# Altium footprint library Transformers.PcbLib: 81 footprints (part 5 of 6)
Each footprint in its own frame and in the unit in brackets; x right, y up, seen from the top. Pads: shape width x height; smd on the part's side, far side on the other; paste and mask are expansions set on the pad; w line width, h text height; cw(c..) or ccw(c..) is an arc to the next point about the centre after c.
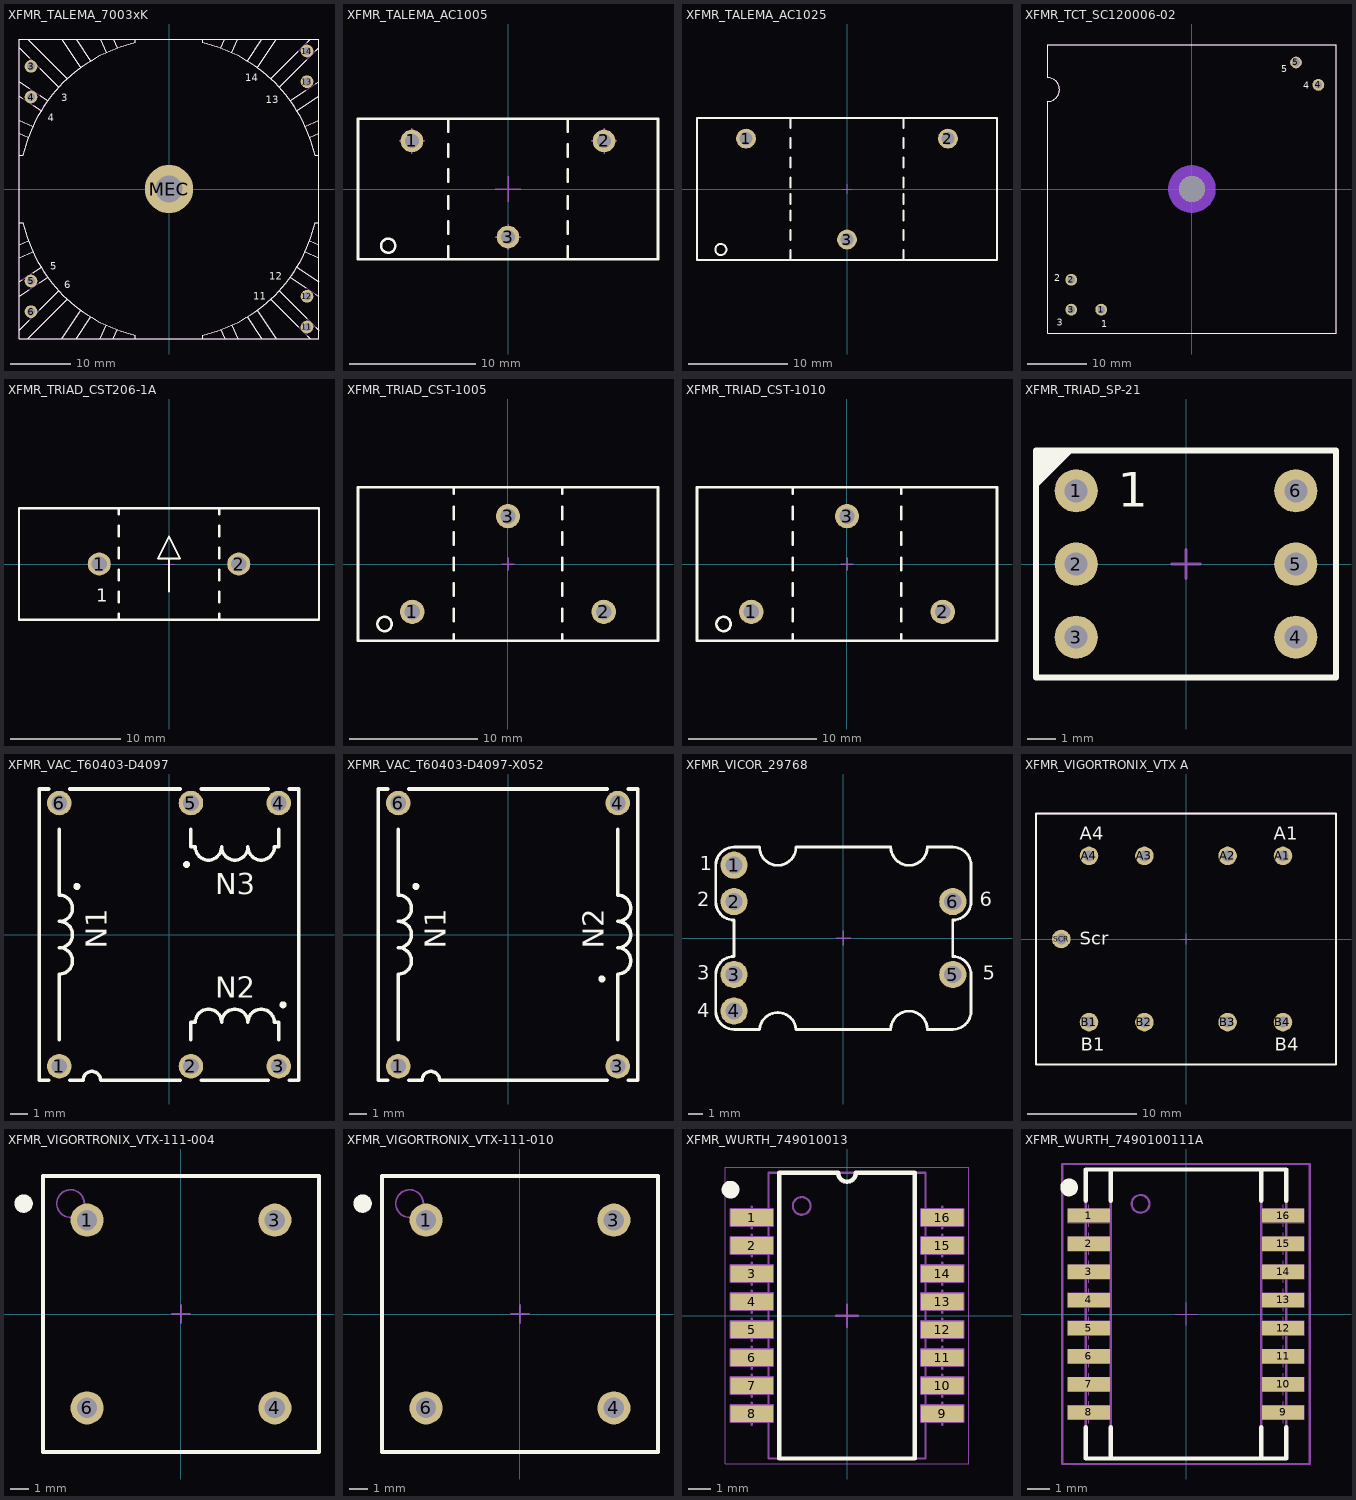
[diagram p4: the footprints below, top view; thin cyan lines are the x and y axes]

## XFMR_TALEMA_7003xK [mm] "7VA Toroidal Transformer, Body 49.7mm x 49.7mm, 70000 Serie"
height 23.1
pads (9):
  round 2.1 hole 1.4: 3(-22.86,20.32) 4(-22.86,15.24) 5(-22.86,-15.24) 6(-22.86,-20.32) 11(22.86,-22.86) 12(22.86,-17.78) 13(22.86,17.78) 14(22.86,22.86)
  round 8 hole 4.5: MEC(0,0)
Top Overlay:
  lines w0.2: -24.85,-5.6 -24.199,-5.6 ccw(c0.005,0.005) -5.6,-24.199 -5.6,-24.84 ; -24.85,5.6 -24.199,5.6 cw(c0.005,-0.005) -5.6,24.199 -5.6,24.84 ; -24.84,-23.426 -23.154,-21.74 ; -24.84,-17.8 -23.138,-16.663 ; -24.84,-15.395 -24.295,-15.031 ; -24.84,-11.371 -22.546,-10.421 ; -24.84,-9.207 -23.311,-8.573 ; -24.84,9.207 -23.311,8.573 ; -24.84,11.371 -22.546,10.421 ; -24.84,15.395 -24.295,15.031 ; -24.84,17.8 -23.138,16.663 ; -24.84,23.426 -23.154,21.74 ; -23.426,-24.84 -16.842,-18.256 ; -23.426,24.84 -16.842,18.256 ; -22.504,-13.834 -21.191,-12.957 ; -22.504,13.834 -21.191,12.957 ; -21.44,-20.026 -18.256,-16.842 ; -21.44,20.026 -18.256,16.842 ; -21.439,-15.528 -20.08,-14.619 ; -21.439,15.528 -20.08,14.619 ; -17.8,-24.84 -14.619,-20.08 ; -17.8,24.84 -14.619,20.08 ; -15.395,-24.84 -12.957,-21.191 ; -15.395,24.84 -12.957,21.191 ; -11.371,-24.84 -10.421,-22.546 ; -11.371,24.84 -10.421,22.546 ; -9.207,-24.84 -8.573,-23.311 ; -9.207,24.84 -8.573,23.311 ; 5.6,-24.84 5.6,-24.199 ccw(c-0.005,0.005) 24.199,-5.6 24.85,-5.6 ; 5.6,24.84 5.6,24.199 cw(c-0.005,-0.005) 24.199,5.6 24.85,5.6 ; 8.573,-23.311 9.207,-24.84 ; 8.573,23.311 9.207,24.84 ; 10.421,-22.546 11.371,-24.84 ; 10.421,22.546 11.371,24.84 ; 12.957,-21.191 15.395,-24.84 ; 12.957,21.191 15.395,24.84 ; 14.619,-20.08 17.8,-24.84 ; 14.619,20.08 17.8,24.84 ; 16.842,-18.256 21.41,-22.825 ; 16.842,18.256 21.41,22.825 ; 18.256,-16.842 22.825,-21.41 ; 18.256,16.842 22.825,21.41 ; 20.08,-14.619 22.66,-16.344 ; 20.08,14.619 22.66,16.344 ; 21.191,-12.957 24.84,-15.395 ; 21.191,12.957 24.84,15.395 ; 22.546,-10.421 24.84,-11.371 ; 22.546,10.421 24.84,11.371 ; 22.895,-24.31 23.426,-24.84 ; 22.895,24.31 23.426,24.84 ; 23.311,-8.573 24.84,-9.207 ; 23.311,8.573 24.84,9.207 ; 24.263,-17.415 24.84,-17.8 ; 24.263,17.415 24.84,17.8 ; 24.31,-22.895 24.84,-23.426 ; 24.31,22.895 24.84,23.426 ; -24.85,-24.85 -24.84,24.84 24.85,24.84 24.84,-24.84 -24.85,-24.85 ; -24.85,-24.85 24.85,-24.85 24.85,24.85 -24.85,24.85 -24.85,-24.85
  text "14" at 12.625,17.875 h1.2
  text "13" at 16.05,14.175 h1.2
  text "11" at 13.925,-18.325 h1.2
  text "12" at 16.6,-15 h1.2
  text "5" at -19.65,-13.375 h1.2
  text "6" at -17.35,-16.475 h1.2
  text "4" at -20.1,11.25 h1.2
  text "3" at -17.85,14.55 h1.2
Mechanical 8:
  lines w0.1: -23.36,-20.32 -22.86,-20.32 ; -23.36,-15.24 -22.86,-15.24 ; -23.36,15.24 -22.86,15.24 ; -23.36,20.32 -22.86,20.32 ; -22.86,-20.82 -22.86,-20.32 ; -22.86,-19.82 -22.86,-20.32 ; -22.86,-15.74 -22.86,-15.24 ; -22.86,-14.74 -22.86,-15.24 ; -22.86,14.74 -22.86,15.24 ; -22.86,15.74 -22.86,15.24 ; -22.86,19.82 -22.86,20.32 ; -22.86,20.82 -22.86,20.32 ; -22.36,-20.32 -22.86,-20.32 ; -22.36,-15.24 -22.86,-15.24 ; -22.36,15.24 -22.86,15.24 ; -22.36,20.32 -22.86,20.32 ; -0.5,0 0,0 ; 0,-0.5 0,0 ; 0,0.5 0,0 ; 0.5,0 0,0 ; 22.36,-22.86 22.86,-22.86 ; 22.36,-17.78 22.86,-17.78 ; 22.36,17.78 22.86,17.78 ; 22.36,22.86 22.86,22.86 ; 22.86,-23.36 22.86,-22.86 ; 22.86,-22.36 22.86,-22.86 ; 22.86,-18.28 22.86,-17.78 ; 22.86,-17.28 22.86,-17.78 ; 22.86,17.28 22.86,17.78 ; 22.86,18.28 22.86,17.78 ; 22.86,22.36 22.86,22.86 ; 22.86,23.36 22.86,22.86 ; 23.36,-22.86 22.86,-22.86 ; 23.36,-17.78 22.86,-17.78 ; 23.36,17.78 22.86,17.78 ; 23.36,22.86 22.86,22.86
Mechanical 14:
  lines w0.1: -24.85,-5.6 -24.199,-5.6 ccw(c0.005,0.005) -5.6,-24.199 -5.6,-24.84 ; -24.85,5.6 -24.199,5.6 cw(c0.005,-0.005) -5.6,24.199 -5.6,24.84 ; -24.84,-23.426 -18.256,-16.842 ; -24.84,-17.8 -20.08,-14.619 ; -24.84,-15.395 -21.191,-12.957 ; -24.84,-11.371 -22.546,-10.421 ; -24.84,-9.207 -23.311,-8.573 ; -24.84,9.207 -23.311,8.573 ; -24.84,11.371 -22.546,10.421 ; -24.84,15.395 -21.191,12.957 ; -24.84,17.8 -20.08,14.619 ; -24.84,23.426 -18.256,16.842 ; -23.426,-24.84 -16.842,-18.256 ; -23.426,24.84 -16.842,18.256 ; -17.8,-24.84 -14.619,-20.08 ; -17.8,24.84 -14.619,20.08 ; -15.395,-24.84 -12.957,-21.191 ; -15.395,24.84 -12.957,21.191 ; -11.371,-24.84 -10.421,-22.546 ; -11.371,24.84 -10.421,22.546 ; -9.207,-24.84 -8.573,-23.311 ; -9.207,24.84 -8.573,23.311 ; 5.6,-24.84 5.6,-24.199 ccw(c-0.005,0.005) 24.199,-5.6 24.85,-5.6 ; 5.6,24.84 5.6,24.199 cw(c-0.005,-0.005) 24.199,5.6 24.85,5.6 ; 8.573,-23.311 9.207,-24.84 ; 8.573,23.311 9.207,24.84 ; 10.421,-22.546 11.371,-24.84 ; 10.421,22.546 11.371,24.84 ; 12.957,-21.191 15.395,-24.84 ; 12.957,21.191 15.395,24.84 ; 14.619,-20.08 17.8,-24.84 ; 14.619,20.08 17.8,24.84 ; 16.842,-18.256 23.426,-24.84 ; 16.842,18.256 23.426,24.84 ; 18.256,-16.842 24.84,-23.426 ; 18.256,16.842 24.84,23.426 ; 20.08,-14.619 24.84,-17.8 ; 20.08,14.619 24.84,17.8 ; 21.191,-12.957 24.84,-15.395 ; 21.191,12.957 24.84,15.395 ; 22.546,-10.421 24.84,-11.371 ; 22.546,10.421 24.84,11.371 ; 23.311,-8.573 24.84,-9.207 ; 23.311,8.573 24.84,9.207 ; -24.85,-24.85 -24.84,24.84 24.85,24.84 24.84,-24.84 -24.85,-24.85 ; -24.85,-24.85 24.85,-24.85 24.85,24.85 -24.85,24.85 -24.85,-24.85
3D body "XFMR_TALEMA_7003xK.stp": height 23.1, standoff -3.8, extent -24.85,-24.85 24.85,24.85

## XFMR_TALEMA_AC1005 [mm] "Low Cost 50/60Hz 5A Current Transformer, Body 23.8mm x 11.12mm"
height 23.8
pads (3):
  round 1.8 hole 1.1: 1(-7.62,3.81) 2(7.62,3.81) 3(0,-3.81)
Top Overlay:
  circle w0.2: c-9.5,-4.5 r0.559
  lines w0.2: -4.75,-5.56 -4.75,-4.56 ; -4.75,-3.56 -4.75,-2.56 ; -4.75,-1.56 -4.75,-0.56 ; -4.75,0.56 -4.75,1.56 ; -4.75,2.56 -4.75,3.56 ; -4.75,4.56 -4.75,5.56 ; 4.75,-5.56 4.75,-4.56 ; 4.75,-3.56 4.75,-2.56 ; 4.75,-1.56 4.75,-0.56 ; 4.75,0.56 4.75,1.56 ; 4.75,2.56 4.75,3.56 ; 4.75,4.56 4.75,5.56 ; -11.9,-5.56 -11.9,5.56 11.9,5.56 11.9,-5.56 -11.9,-5.56
Mechanical 8:
  lines w0.1: -8.62,3.81 -7.62,3.81 ; -7.62,2.81 -7.62,3.81 ; -7.62,4.81 -7.62,3.81 ; -6.62,3.81 -7.62,3.81 ; -1,-3.81 0,-3.81 ; -1,0 0,0 ; 0,-4.81 0,-3.81 ; 0,-2.81 0,-3.81 ; 0,-1 0,0 ; 0,1 0,0 ; 1,-3.81 0,-3.81 ; 1,0 0,0 ; 6.62,3.81 7.62,3.81 ; 7.62,2.81 7.62,3.81 ; 7.62,4.81 7.62,3.81 ; 8.62,3.81 7.62,3.81
Mechanical 14:
  circle w0.1: c-9.5,-4.5 r0.559
  lines w0.1: -4.75,-5.56 -4.75,-4.56 ; -4.75,-3.56 -4.75,-2.56 ; -4.75,-1.56 -4.75,-0.56 ; -4.75,0.56 -4.75,1.56 ; -4.75,2.56 -4.75,3.56 ; -4.75,4.56 -4.75,5.56 ; 4.75,-5.56 4.75,-4.56 ; 4.75,-3.56 4.75,-2.56 ; 4.75,-1.56 4.75,-0.56 ; 4.75,0.56 4.75,1.56 ; 4.75,2.56 4.75,3.56 ; 4.75,4.56 4.75,5.56 ; -11.9,-5.56 -11.9,5.56 11.9,5.56 11.9,-5.56 -11.9,-5.56
3D body "XFMR_TALEMA_AC1005.stp": height 23.8, standoff -3.8, extent -11.9,-5.56 11.9,5.56

## XFMR_TALEMA_AC1025 [mm] "Low Cost 50/60Hz 25A Current Transformer, Body 30.2mm x 14.3mm"
height 30.2
pads (3):
  round 2 hole 1.3: 1(-10.16,5.07) 2(10.16,5.07) 3(0,-5.09)
Top Overlay:
  circle w0.2: c-12.7,-6.09 r0.559
  lines w0.2: -5.7,-7.15 -5.7,-6.15 ; -5.7,-5.15 -5.7,-4.15 ; -5.7,-3.15 -5.7,-2.15 ; -5.7,-1.5 -5.7,-0.5 ; -5.7,0.15 -5.7,1.15 ; -5.7,2.15 -5.7,3.15 ; -5.7,4.15 -5.7,5.15 ; -5.7,6.15 -5.7,7.15 ; 5.7,-7.15 5.7,-6.15 ; 5.7,-5.15 5.7,-4.15 ; 5.7,-3.15 5.7,-2.15 ; 5.7,-1.5 5.7,-0.5 ; 5.7,0.15 5.7,1.15 ; 5.7,2.15 5.7,3.15 ; 5.7,4.15 5.7,5.15 ; 5.7,6.15 5.7,7.15 ; -15.1,-7.15 15.1,-7.15 15.1,7.15 -15.1,7.15 -15.1,-7.15
Mechanical 8:
  lines w0.1: -10.66,5.07 -10.16,5.07 ; -10.16,4.57 -10.16,5.07 ; -10.16,5.57 -10.16,5.07 ; -9.66,5.07 -10.16,5.07 ; -0.5,-5.09 0,-5.09 ; -0.5,0 0,0 ; 0,-5.59 0,-5.09 ; 0,-4.59 0,-5.09 ; 0,-0.5 0,0 ; 0,0.5 0,0 ; 0.5,-5.09 0,-5.09 ; 0.5,0 0,0 ; 9.66,5.07 10.16,5.07 ; 10.16,4.57 10.16,5.07 ; 10.16,5.57 10.16,5.07 ; 10.66,5.07 10.16,5.07
Mechanical 14:
  circle w0.1: c-12.7,-6.09 r0.559
  lines w0.1: -5.7,-7.15 -5.7,-6.15 ; -5.7,-5.15 -5.7,-4.15 ; -5.7,-3.15 -5.7,-2.15 ; -5.7,-1.5 -5.7,-0.5 ; -5.7,0.15 -5.7,1.15 ; -5.7,2.15 -5.7,3.15 ; -5.7,4.15 -5.7,5.15 ; -5.7,6.15 -5.7,7.15 ; 5.7,-7.15 5.7,-6.15 ; 5.7,-5.15 5.7,-4.15 ; 5.7,-3.15 5.7,-2.15 ; 5.7,-1.5 5.7,-0.5 ; 5.7,0.15 5.7,1.15 ; 5.7,2.15 5.7,3.15 ; 5.7,4.15 5.7,5.15 ; 5.7,6.15 5.7,7.15 ; -15.1,-7.15 -15.1,7.15 15.1,7.15 15.1,-7.15 -15.1,-7.15
3D body "XFMR_TALEMA_AC1025.stp": height 30.19, standoff -3.8, extent -15.1,-7.15 15.1,7.15

## XFMR_TCT_SC120006-02 [mm] "Pulse Transformer"
height 40
pads (6):
  round 2 hole 1.3: 1(-15.42,-20.5) 2(-20.5,-15.42) 3(-20.5,-20.5) 4(21.51,17.7) 5(17.7,21.51)
  round 0.5 hole 4.4 unplated mask+1.95: 6(0,0)
Bottom Layer keep-out:
  region: 0,-4 -0.262,-4 -0.782,-3.932 -1.289,-3.796 -1.773,-3.595 -2.227,-3.333 -2.643,-3.014 -3.014,-2.643 -3.333,-2.227 -3.595,-1.773 -3.796,-1.289 -3.932,-0.782 -4,-0.262 -4,0 -4,0.262 -3.932,0.782 -3.796,1.289 -3.595,1.773 -3.333,2.227 -3.014,2.643 -2.643,3.014 -2.227,3.333 -1.773,3.595 -1.289,3.796 -0.782,3.932 -0.262,4 0,4 0.262,4 0.782,3.932 1.289,3.796 1.773,3.595 2.227,3.333 2.643,3.014 3.014,2.643 3.333,2.227 3.595,1.773 3.796,1.289 3.932,0.782 4,0.262 4,0 4,-0.262 3.932,-0.782 3.796,-1.289 3.595,-1.773 3.333,-2.227 3.014,-2.643 2.643,-3.014 2.227,-3.333 1.773,-3.595 1.289,-3.796 0.782,-3.932 0.262,-4
Top Overlay:
  lines w0.2: -24.5,-24.5 24.5,-24.5 24.5,24.5 -24.5,24.5 -24.5,18.9 cw(c-24.5,16.9) -24.5,14.9 -24.5,-24.5
  text "1" at -15.434,-23.475 h1.2
  text "2" at -23.368,-15.725 h1.2
  text "3" at -23.013,-23.225 h1.2
  text "4" at 18.943,17.025 h1.2
  text "5" at 15.172,19.825 h1.2
Mechanical 8:
  lines w0.1: -21,-20.5 -20.5,-20.5 ; -21,-15.42 -20.5,-15.42 ; -20.5,-21 -20.5,-20.5 ; -20.5,-20 -20.5,-20.5 ; -20.5,-15.92 -20.5,-15.42 ; -20.5,-14.92 -20.5,-15.42 ; -20,-20.5 -20.5,-20.5 ; -20,-15.42 -20.5,-15.42 ; -15.92,-20.5 -15.42,-20.5 ; -15.42,-21 -15.42,-20.5 ; -15.42,-20 -15.42,-20.5 ; -14.92,-20.5 -15.42,-20.5 ; -0.5,0 0,0 ; 0,-0.5 0,0 ; 0,0.5 0,0 ; 0.5,0 0,0 ; 17.2,21.51 17.7,21.51 ; 17.7,21.01 17.7,21.51 ; 17.7,22.01 17.7,21.51 ; 18.2,21.51 17.7,21.51 ; 21.01,17.7 21.51,17.7 ; 21.51,17.2 21.51,17.7 ; 21.51,18.2 21.51,17.7 ; 22.01,17.7 21.51,17.7
Mechanical 14:
  circle w0.1: c0,0 r2.2
  lines w0.1: -24.5,-24.5 24.5,-24.5 24.5,24.5 -24.5,24.5 -24.5,18.9 cw(c-24.5,16.9) -24.5,14.9 -24.5,-24.5
  text "1" at -15.434,-23.475 h1.2
  text "2" at -23.368,-15.725 h1.2
  text "3" at -23.013,-23.225 h1.2
  text "4" at 18.943,17.025 h1.2
  text "5" at 15.172,19.825 h1.2
3D body "XFMR_TCT_SC120006-02.stp": height 40, standoff -3.6, extent -24.5,-24.5 24.5,24.5

## XFMR_TRIAD_CST206-1A [mm] "Current Sensing Transformer - Body 27.305 x 10.16mm x 31.115 H"
height 31.115
pads (2):
  round 2.1 hole 1.4: 1(-6.35,0) 2(6.35,0)
Top Overlay:
  lines w0.2: -4.572,-5.08 -4.572,-4.5 ; -4.572,-3.5 -4.572,-2.5 ; -4.572,-1.5 -4.572,-0.5 ; -4.572,0.5 -4.572,1.5 ; -4.572,2.5 -4.572,3.5 ; -4.572,4.5 -4.572,5.08 ; 0,-2.5 0,0.5 ; 4.572,-5.08 4.572,-4.5 ; 4.572,-3.5 4.572,-2.5 ; 4.572,-1.5 4.572,-0.5 ; 4.572,0.5 4.572,1.5 ; 4.572,2.5 4.572,3.5 ; 4.572,4.5 4.572,5.08 ; 0,0.5 1,0.5 0,2.5 -1,0.5 0,0.5 ; -13.653,-5.08 0,-5.08 13.653,-5.08 13.653,5.08 0,5.08 -13.653,5.08 -13.653,-5.08
  text "1" at -6.636,-3.417 h1.2
Mechanical 8:
  lines w0.1: -6.85,0 -6.35,0 ; -6.35,-0.5 -6.35,0 ; -6.35,0.5 -6.35,0 ; -5.85,0 -6.35,0 ; -0.5,0 0,0 ; 0,-0.5 0,0 ; 0,0.5 0,0 ; 0.5,0 0,0 ; 5.85,0 6.35,0 ; 6.35,-0.5 6.35,0 ; 6.35,0.5 6.35,0 ; 6.85,0 6.35,0
Mechanical 14:
  lines w0.1: -4.572,-5.08 -4.572,-4.5 ; -4.572,-3.5 -4.572,-2.5 ; -4.572,-1.5 -4.572,-0.5 ; -4.572,0.5 -4.572,1.5 ; -4.572,2.5 -4.572,3.5 ; -4.572,4.5 -4.572,5.08 ; 0,-2.5 0,0.5 ; 4.572,-5.08 4.572,-4.5 ; 4.572,-3.5 4.572,-2.5 ; 4.572,-1.5 4.572,-0.5 ; 4.572,0.5 4.572,1.5 ; 4.572,2.5 4.572,3.5 ; 4.572,4.5 4.572,5.08 ; 0,0.5 1,0.5 0,2.5 -1,0.5 0,0.5 ; -13.653,-5.08 0,-5.08 13.653,-5.08 13.653,5.08 0,5.08 -13.653,5.08 -13.653,-5.08
  text "1" at -6.636,-3.417 h1.2
3D body "XFMR_TRIAD_CST206-1A.stp": height 31.11, standoff -3.6, extent -13.652,-5.08 13.653,5.08

## XFMR_TRIAD_CST-1005 [mm] "Current Sensing Transformer - Body 23.5 L x 12mm W x 24.8 H"
height 24.8
pads (3):
  round 1.9 hole 1.2: 1(-7.5,-3.75) 2(7.5,-3.75) 3(0,3.75)
Top Overlay:
  circle w0.2: c-9.675,-4.7 r0.559
  lines w0.2: -4.25,-6 -4.25,-5.5 ; -4.25,-4.5 -4.25,-3.5 ; -4.25,-2.5 -4.25,-1.5 ; -4.25,-0.5 -4.25,0.5 ; -4.25,1.5 -4.25,2.5 ; -4.25,3.5 -4.25,4.5 ; -4.25,5.5 -4.25,6 ; 4.25,-6 4.25,-5.5 ; 4.25,-4.5 4.25,-3.5 ; 4.25,-2.5 4.25,-1.5 ; 4.25,-0.5 4.25,0.5 ; 4.25,1.5 4.25,2.5 ; 4.25,3.5 4.25,4.5 ; 4.25,5.5 4.25,6 ; -11.75,-6 -11.75,6 11.75,6 11.75,-6 -11.75,-6
Mechanical 8:
  lines w0.1: -8,-3.75 -7.5,-3.75 ; -7.5,-4.25 -7.5,-3.75 ; -7.5,-3.25 -7.5,-3.75 ; -7,-3.75 -7.5,-3.75 ; -0.5,0 0,0 ; -0.5,3.75 0,3.75 ; 0,-0.5 0,0 ; 0,0.5 0,0 ; 0,3.25 0,3.75 ; 0,4.25 0,3.75 ; 0.5,0 0,0 ; 0.5,3.75 0,3.75 ; 7,-3.75 7.5,-3.75 ; 7.5,-4.25 7.5,-3.75 ; 7.5,-3.25 7.5,-3.75 ; 8,-3.75 7.5,-3.75
Mechanical 14:
  circle w0.1: c-9.675,-4.7 r0.559
  lines w0.1: -4.25,-6 -4.25,-5.5 ; -4.25,-4.5 -4.25,-3.5 ; -4.25,-2.5 -4.25,-1.5 ; -4.25,-0.5 -4.25,0.5 ; -4.25,1.5 -4.25,2.5 ; -4.25,3.5 -4.25,4.5 ; -4.25,5.5 -4.25,6 ; 4.25,-6 4.25,-5.5 ; 4.25,-4.5 4.25,-3.5 ; 4.25,-2.5 4.25,-1.5 ; 4.25,-0.5 4.25,0.5 ; 4.25,1.5 4.25,2.5 ; 4.25,3.5 4.25,4.5 ; 4.25,5.5 4.25,6 ; -11.75,-6 -11.75,6 11.75,6 11.75,-6 -11.75,-6
3D body "XFMR_TRIAD_CST-1005.stp": height 24.78, standoff -3.8, extent -11.75,-6 11.75,6

## XFMR_TRIAD_CST-1010 [mm] "Current Sensing Transformer - Body 23.5 L x 12mm W x 24.8 H"
height 24.8
pads (3):
  round 1.9 hole 1.2: 1(-7.5,-3.75) 2(7.5,-3.75) 3(0,3.75)
Top Overlay:
  circle w0.2: c-9.675,-4.7 r0.559
  lines w0.2: -4.25,-6 -4.25,-5.5 ; -4.25,-4.5 -4.25,-3.5 ; -4.25,-2.5 -4.25,-1.5 ; -4.25,-0.5 -4.25,0.5 ; -4.25,1.5 -4.25,2.5 ; -4.25,3.5 -4.25,4.5 ; -4.25,5.5 -4.25,6 ; 4.25,-6 4.25,-5.5 ; 4.25,-4.5 4.25,-3.5 ; 4.25,-2.5 4.25,-1.5 ; 4.25,-0.5 4.25,0.5 ; 4.25,1.5 4.25,2.5 ; 4.25,3.5 4.25,4.5 ; 4.25,5.5 4.25,6 ; -11.75,-6 11.75,-6 11.75,6 -11.75,6 -11.75,-6
Mechanical 8:
  lines w0.1: -8,-3.75 -7.5,-3.75 ; -7.5,-4.25 -7.5,-3.75 ; -7.5,-3.25 -7.5,-3.75 ; -7,-3.75 -7.5,-3.75 ; -0.5,0 0,0 ; -0.5,3.75 0,3.75 ; 0,-0.5 0,0 ; 0,0.5 0,0 ; 0,3.25 0,3.75 ; 0,4.25 0,3.75 ; 0.5,0 0,0 ; 0.5,3.75 0,3.75 ; 7,-3.75 7.5,-3.75 ; 7.5,-4.25 7.5,-3.75 ; 7.5,-3.25 7.5,-3.75 ; 8,-3.75 7.5,-3.75
Mechanical 14:
  circle w0.1: c-9.675,-4.7 r0.559
  lines w0.1: -4.25,-6 -4.25,-5.5 ; -4.25,-4.5 -4.25,-3.5 ; -4.25,-2.5 -4.25,-1.5 ; -4.25,-0.5 -4.25,0.5 ; -4.25,1.5 -4.25,2.5 ; -4.25,3.5 -4.25,4.5 ; -4.25,5.5 -4.25,6 ; 4.25,-6 4.25,-5.5 ; 4.25,-4.5 4.25,-3.5 ; 4.25,-2.5 4.25,-1.5 ; 4.25,-0.5 4.25,0.5 ; 4.25,1.5 4.25,2.5 ; 4.25,3.5 4.25,4.5 ; 4.25,5.5 4.25,6 ; -11.75,-6 11.75,-6 11.75,6 -11.75,6 -11.75,-6
3D body "XFMR_TRIAD_CST-1005.stp": height 24.78, standoff -3.8, extent -11.75,-6 11.75,6

## XFMR_TRIAD_SP-21 [mm] "Audio Transformer- Body 10.41X7.87mm"
height 11.8
pads (6):
  round 1.5 hole 0.8: 1(-3.81,2.54) 2(-3.81,0) 3(-3.81,-2.54) 4(3.81,-2.54) 5(3.81,0) 6(3.81,2.54)
Top Overlay:
  lines w0.2: -5.205,2.75 -4.023,3.933 ; -5.205,3 -4.25,3.935 ; -5.205,3.25 -4.5,3.935 ; -5.205,3.5 -4.75,3.935 ; -5.2,3.75 -5.015,3.935 ; -5.205,-3.935 -5.205,3.935 5.205,3.935 5.205,-3.935 -5.205,-3.935
  text "1" at -2.361,1.983 h1.2
Mechanical 8:
  lines w0.1: -4.31,-2.54 -3.81,-2.54 ; -4.31,0 -3.81,0 ; -4.31,2.54 -3.81,2.54 ; -3.81,-3.04 -3.81,-2.54 ; -3.81,-2.04 -3.81,-2.54 ; -3.81,-0.5 -3.81,0 ; -3.81,0.5 -3.81,0 ; -3.81,2.04 -3.81,2.54 ; -3.81,3.04 -3.81,2.54 ; -3.31,-2.54 -3.81,-2.54 ; -3.31,0 -3.81,0 ; -3.31,2.54 -3.81,2.54 ; -0.5,0 0,0 ; 0,-0.5 0,0 ; 0,0.5 0,0 ; 0.5,0 0,0 ; 3.31,-2.54 3.81,-2.54 ; 3.31,0 3.81,0 ; 3.31,2.54 3.81,2.54 ; 3.81,-3.04 3.81,-2.54 ; 3.81,-2.04 3.81,-2.54 ; 3.81,-0.5 3.81,0 ; 3.81,0.5 3.81,0 ; 3.81,2.04 3.81,2.54 ; 3.81,3.04 3.81,2.54 ; 4.31,-2.54 3.81,-2.54 ; 4.31,0 3.81,0 ; 4.31,2.54 3.81,2.54
Mechanical 14:
  lines w0.1: -5.205,-3.935 5.205,-3.935 5.205,3.935 -5.205,3.935 -5.205,-3.935
  text "1" at -2.361,1.983 h1.2
3D body "XFMR_TRIAD_SP-21.stp": height 11.8, standoff -3.49, extent -5.205,-3.935 5.205,3.935

## XFMR_VAC_T60403-D4097 [mm] "VACUUMSCHMELZE Drive Transformer - Body 14.8X16.6mm"
height 13.5
pads (6):
  round 1.4 hole 0.9: 1(-6.25,-7.5) 2(1.25,-7.5) 3(6.25,-7.5) 4(6.25,7.5) 5(1.25,7.5) 6(-6.25,7.5)
Top Overlay:
  circle w0.2: c6.5,-4 r0.1
  circle w0.2: c1,4 r0.1
  circle w0.2: c-5.25,2.75 r0.1
  lines w0.2: -6.85,-8.3 -7.4,-8.3 -7.4,8.3 -6.85,8.3 ; -6.25,-6 -6.25,-2.25 ccw(c-6.25,-1.5) -6.25,-0.75 ccw(c-6.25,0) -6.25,0.75 ccw(c-6.25,1.5) -6.25,2.25 -6.25,6 ; -5.65,-8.3 -4.9,-8.3 cw(c-4.4,-8.3) -3.9,-8.3 0.65,-8.3 ; -5.65,8.3 0.65,8.3 ; 1.25,-6 1.25,-5 1.5,-5 cw(c2.25,-5) 3,-5 cw(c3.75,-5) 4.5,-5 cw(c5.25,-5) 6,-5 6.25,-5 6.25,-6 ; 1.25,6 1.25,5 1.5,5 ccw(c2.25,5) 3,5 ccw(c3.75,5) 4.5,5 ccw(c5.25,5) 6,5 6.25,5 6.25,6 ; 1.85,-8.3 5.65,-8.3 ; 1.85,8.3 5.65,8.3 ; 6.85,-8.3 7.4,-8.3 7.4,8.3 6.85,8.3
  text "N2" at 2.643,-3.6 h1.2
  text "N3" at 2.643,2.3 h1.2
  text "N1" at -3.55,-0.807 h1.2
Mechanical 14:
  circle w0.1: c6.5,-4 r0.1
  circle w0.1: c1,4 r0.1
  circle w0.1: c-5.25,2.75 r0.1
  lines w0.1: -6.85,-8.3 -7.4,-8.3 -7.4,8.3 -6.85,8.3 ; -6.25,-6 -6.25,-2.25 ccw(c-6.25,-1.5) -6.25,-0.75 ccw(c-6.25,0) -6.25,0.75 ccw(c-6.25,1.5) -6.25,2.25 -6.25,6 ; -5.65,-8.3 -4.9,-8.3 cw(c-4.4,-8.3) -3.9,-8.3 0.65,-8.3 ; -5.65,8.3 0.65,8.3 ; 1.25,-6 1.25,-5 1.5,-5 cw(c2.25,-5) 3,-5 cw(c3.75,-5) 4.5,-5 cw(c5.25,-5) 6,-5 6.25,-5 6.25,-6 ; 1.25,6 1.25,5 1.5,5 ccw(c2.25,5) 3,5 ccw(c3.75,5) 4.5,5 ccw(c5.25,5) 6,5 6.25,5 6.25,6 ; 1.85,-8.3 5.65,-8.3 ; 1.85,8.3 5.65,8.3 ; 6.85,-8.3 7.4,-8.3 7.4,8.3 6.85,8.3
  text "N2" at 2.643,-3.6 h1.2
  text "N3" at 2.643,2.3 h1.2
  text "N1" at -3.55,-0.807 h1.2
3D body "XFMR_VAC_T60403-D4097.stp": height 13.5, standoff -3.6, extent -7.4,-8.3 7.4,8.3

## XFMR_VAC_T60403-D4097-X052 [mm] "VACUUMSCHMELZE Drive Transformer - Body 14.8X16.6mm"
height 13.5
pads (4):
  round 1.4 hole 0.9: 1(-6.25,-7.5) 3(6.25,-7.5) 4(6.25,7.5) 6(-6.25,7.5)
Top Overlay:
  circle w0.2: c5.35,-2.525 r0.1
  circle w0.2: c-5.25,2.75 r0.1
  lines w0.2: -6.85,-8.3 -7.4,-8.3 -7.4,8.3 -6.85,8.3 ; -6.25,-6 -6.25,-2.25 ccw(c-6.25,-1.5) -6.25,-0.75 ccw(c-6.25,0) -6.25,0.75 ccw(c-6.25,1.5) -6.25,2.25 -6.25,6 ; -5.65,-8.3 -4.9,-8.3 cw(c-4.4,-8.3) -3.9,-8.3 5.65,-8.3 ; -5.65,8.3 5.65,8.3 ; 6.25,-6 6.25,-2.25 ccw(c6.25,-1.5) 6.25,-0.75 ccw(c6.25,0) 6.25,0.75 ccw(c6.25,1.5) 6.25,2.25 6.25,6 ; 6.85,-8.3 7.4,-8.3 7.4,8.3 6.85,8.3
  text "N2" at 5.45,-0.807 h1.2
  text "N1" at -3.55,-0.807 h1.2
Mechanical 14:
  circle w0.1: c5.35,-2.525 r0.1
  circle w0.1: c-5.25,2.75 r0.1
  lines w0.1: -6.85,-8.3 -7.4,-8.3 -7.4,8.3 -6.85,8.3 ; -6.25,-6 -6.25,-2.25 ccw(c-6.25,-1.5) -6.25,-0.75 ccw(c-6.25,0) -6.25,0.75 ccw(c-6.25,1.5) -6.25,2.25 -6.25,6 ; -5.65,-8.3 -4.9,-8.3 cw(c-4.4,-8.3) -3.9,-8.3 5.65,-8.3 ; -5.65,8.3 5.65,8.3 ; 6.25,-6 6.25,-2.25 ccw(c6.25,-1.5) 6.25,-0.75 ccw(c6.25,0) 6.25,0.75 ccw(c6.25,1.5) 6.25,2.25 6.25,6 ; 6.85,-8.3 7.4,-8.3 7.4,8.3 6.85,8.3
  text "N2" at 5.45,-0.807 h1.2
  text "N1" at -3.55,-0.807 h1.2
3D body "XFMR_VAC_T60403-D4097-X052.stp": height 13.5, standoff -3.6, extent -7.4,-8.3 7.4,8.3

## XFMR_VICOR_29768 [mm] "PR Bus Isolation Transformer - Body 17.78mm x 12.7"
height 9.14
pads (6):
  round 1.9 hole 1.2: 1(-7.62,5.08) 2(-7.62,2.54) 3(-7.62,-2.54) 4(-7.62,-5.08) 5(7.62,-2.54) 6(7.62,2.54)
Top Overlay:
  lines w0.2: -8.89,-5.094 ccw(c-7.62,-5.094) -7.62,-6.364 -5.842,-6.364 cw(c-4.572,-6.464) -3.302,-6.364 3.302,-6.364 cw(c4.572,-6.364) 5.842,-6.364 7.62,-6.364 ccw(c7.62,-5.094) 8.89,-5.094 8.89,-2.554 ccw(c7.62,-2.554) 7.62,-1.284 7.62,1.256 ccw(c7.62,2.526) 8.89,2.526 8.89,5.066 ccw(c7.62,5.066) 7.62,6.336 5.842,6.336 cw(c4.572,6.336) 3.302,6.336 -3.302,6.336 cw(c-4.572,6.336) -5.842,6.336 -7.62,6.336 ccw(c-7.62,5.066) -8.89,5.066 -8.89,2.526 ccw(c-7.62,2.526) -7.62,1.256 -7.62,-1.284 ccw(c-7.62,-2.554) -8.89,-2.554 -8.89,-5.094
  text "1" at -10,4.74 h1
  text "4" at -10.2,-5.5 h1
  text "2" at -10.2,2.2 h1
  text "3" at -10.2,-2.9 h1
  text "6" at 9.5,2.2 h1
  text "5" at 9.7,-2.9 h1
Mechanical 8:
  lines w0.1: -8.12,-5.08 -7.62,-5.08 ; -8.12,-2.54 -7.62,-2.54 ; -8.12,2.54 -7.62,2.54 ; -8.12,5.08 -7.62,5.08 ; -7.62,-5.58 -7.62,-5.08 ; -7.62,-4.58 -7.62,-5.08 ; -7.62,-3.04 -7.62,-2.54 ; -7.62,-2.04 -7.62,-2.54 ; -7.62,2.04 -7.62,2.54 ; -7.62,3.04 -7.62,2.54 ; -7.62,4.58 -7.62,5.08 ; -7.62,5.58 -7.62,5.08 ; -7.12,-5.08 -7.62,-5.08 ; -7.12,-2.54 -7.62,-2.54 ; -7.12,2.54 -7.62,2.54 ; -7.12,5.08 -7.62,5.08 ; -0.5,0 0,0 ; 0,-0.5 0,0 ; 0,0.5 0,0 ; 0.5,0 0,0 ; 7.12,-2.54 7.62,-2.54 ; 7.12,2.54 7.62,2.54 ; 7.62,-3.04 7.62,-2.54 ; 7.62,-2.04 7.62,-2.54 ; 7.62,2.04 7.62,2.54 ; 7.62,3.04 7.62,2.54 ; 8.12,-2.54 7.62,-2.54 ; 8.12,2.54 7.62,2.54
Mechanical 14:
  lines w0.1: -8.89,-5.094 ccw(c-7.62,-5.094) -7.62,-6.364 -5.842,-6.364 cw(c-4.572,-6.464) -3.302,-6.364 3.302,-6.364 cw(c4.572,-6.364) 5.842,-6.364 7.62,-6.364 ccw(c7.62,-5.094) 8.89,-5.094 8.89,-2.554 ccw(c7.62,-2.554) 7.62,-1.284 7.62,1.256 ccw(c7.62,2.526) 8.89,2.526 8.89,5.066 ccw(c7.62,5.066) 7.62,6.336 5.842,6.336 cw(c4.572,6.336) 3.302,6.336 -3.302,6.336 cw(c-4.572,6.336) -5.842,6.336 -7.62,6.336 ccw(c-7.62,5.066) -8.89,5.066 -8.89,2.526 ccw(c-7.62,2.526) -7.62,1.256 -7.62,-1.284 ccw(c-7.62,-2.554) -8.89,-2.554 -8.89,-5.094 ; -7.935,-5.395 -7.935,-4.765 -7.305,-4.765 -7.305,-5.395 -7.935,-5.395 ; -7.935,-2.855 -7.935,-2.225 -7.305,-2.225 -7.305,-2.855 -7.935,-2.855 ; -7.935,2.225 -7.935,2.855 -7.305,2.855 -7.305,2.225 -7.935,2.225 ; -7.935,4.765 -7.935,5.395 -7.305,5.395 -7.305,4.765 -7.935,4.765 ; 7.305,-2.855 7.305,-2.225 7.935,-2.225 7.935,-2.855 7.305,-2.855 ; 7.305,2.225 7.305,2.855 7.935,2.855 7.935,2.225 7.305,2.225
  text "5" at 9.7,-2.9 h1
  text "6" at 9.5,2.2 h1
  text "3" at -10.2,-2.9 h1
  text "2" at -10.2,2.2 h1
  text "4" at -10.2,-5.5 h1
  text "1" at -10,4.74 h1
3D body "XFMR_VICOR_29768.stp": height 9.62, standoff -3.31, extent -8.89,-6.364 8.89,6.336

## XFMR_VIGORTRONIX_VTX A [mm] "VIGORTRONIX VTX A-Serie Audio Range Transformer - Body 27.5 x 23mm"
height 22.5
pads (9):
  round 1.7 hole 1: A1(8.89,7.62) A2(3.81,7.62) A3(-3.81,7.62) A4(-8.89,7.62) B1(-8.89,-7.62) B2(-3.81,-7.62) B3(3.81,-7.62) B4(8.89,-7.62) SCR(-11.43,0)
Top Overlay:
  lines w0.2: -13.75,-11.5 -13.75,11.5 13.75,11.5 13.75,-11.5 -13.75,-11.5
  text "Scr" at -9.717,-0.52 h1.2
  text "B4" at 8.148,-10.265 h1.2
  text "B1" at -9.632,-10.265 h1.2
  text "A1" at 8.023,9.1 h1.2
  text "A4" at -9.757,9.1 h1.2
Mechanical 8:
  lines w0.1: -11.93,0 -11.43,0 ; -11.43,-0.5 -11.43,0 ; -11.43,0.5 -11.43,0 ; -10.93,0 -11.43,0 ; -9.39,-7.62 -8.89,-7.62 ; -9.39,7.62 -8.89,7.62 ; -8.89,-8.12 -8.89,-7.62 ; -8.89,-7.12 -8.89,-7.62 ; -8.89,7.12 -8.89,7.62 ; -8.89,8.12 -8.89,7.62 ; -8.39,-7.62 -8.89,-7.62 ; -8.39,7.62 -8.89,7.62 ; -4.31,-7.62 -3.81,-7.62 ; -4.31,7.62 -3.81,7.62 ; -3.81,-8.12 -3.81,-7.62 ; -3.81,-7.12 -3.81,-7.62 ; -3.81,7.12 -3.81,7.62 ; -3.81,8.12 -3.81,7.62 ; -3.31,-7.62 -3.81,-7.62 ; -3.31,7.62 -3.81,7.62 ; -0.5,0 0,0 ; 0,-0.5 0,0 ; 0,0.5 0,0 ; 0.5,0 0,0 ; 3.31,-7.62 3.81,-7.62 ; 3.31,7.62 3.81,7.62 ; 3.81,-8.12 3.81,-7.62 ; 3.81,-7.12 3.81,-7.62 ; 3.81,7.12 3.81,7.62 ; 3.81,8.12 3.81,7.62 ; 4.31,-7.62 3.81,-7.62 ; 4.31,7.62 3.81,7.62 ; 8.39,-7.62 8.89,-7.62 ; 8.39,7.62 8.89,7.62 ; 8.89,-8.12 8.89,-7.62 ; 8.89,-7.12 8.89,-7.62 ; 8.89,7.12 8.89,7.62 ; 8.89,8.12 8.89,7.62 ; 9.39,-7.62 8.89,-7.62 ; 9.39,7.62 8.89,7.62
Mechanical 14:
  lines w0.1: -13.75,-11.5 -13.75,11.5 13.75,11.5 13.75,-11.5 -13.75,-11.5
  text "Scr" at -9.717,-0.52 h1.2
  text "B4" at 8.148,-10.265 h1.2
  text "B1" at -9.632,-10.265 h1.2
  text "A1" at 8.023,9.1 h1.2
  text "A4" at -9.757,9.1 h1.2
3D body "XFMR_VIGORTRONIX_VTX A.stp": height 22.5, standoff -3.6, extent -13.75,-11.5 13.75,11.5

## XFMR_VIGORTRONIX_VTX-111-004 [mm] "VIGORTRONIX VTX Encapsulated Pulse Transformer - Body 15 x 15mm"
height 15.5
pads (4):
  round 1.8 hole 1.1: 1(-5.1,5.1) 3(5.1,5.1) 4(5.1,-5.1) 6(-5.1,-5.1)
Top Overlay:
  circle w0.5: c-8.55,6 r0.25
  lines w0.2: -7.5,-7.5 -7.5,7.5 7.5,7.5 7.5,-7.5 -7.5,-7.5
Mechanical 8:
  lines w0.1: -5.6,-5.1 -5.1,-5.1 ; -5.6,5.1 -5.1,5.1 ; -5.1,-5.6 -5.1,-5.1 ; -5.1,-4.6 -5.1,-5.1 ; -5.1,4.6 -5.1,5.1 ; -5.1,5.6 -5.1,5.1 ; -4.6,-5.1 -5.1,-5.1 ; -4.6,5.1 -5.1,5.1 ; -0.5,0 0,0 ; 0,-0.5 0,0 ; 0,0.5 0,0 ; 0.5,0 0,0 ; 4.6,-5.1 5.1,-5.1 ; 4.6,5.1 5.1,5.1 ; 5.1,-5.6 5.1,-5.1 ; 5.1,-4.6 5.1,-5.1 ; 5.1,4.6 5.1,5.1 ; 5.1,5.6 5.1,5.1 ; 5.6,-5.1 5.1,-5.1 ; 5.6,5.1 5.1,5.1
Mechanical 14:
  circle w0.1: c-6,6 r0.75
  lines w0.1: -7.5,-7.5 -7.5,7.5 7.5,7.5 7.5,-7.5 -7.5,-7.5
3D body "XFMR_VIGORTRONIX_VTX-111-004.stp": height 15.5, standoff -3.6, extent -7.5,-7.5 7.5,7.5

## XFMR_VIGORTRONIX_VTX-111-010 [mm] "VIGORTRONIX VTX Encapsulated Pulse Transformer - Body 15 x 15mm"
height 15.5
pads (4):
  round 1.8 hole 1.1: 1(-5.1,5.1) 3(5.1,5.1) 4(5.1,-5.1) 6(-5.1,-5.1)
Top Overlay:
  circle w0.5: c-8.55,6 r0.25
  lines w0.2: -7.5,-7.5 7.5,-7.5 7.5,7.5 -7.5,7.5 -7.5,-7.5
Mechanical 8:
  lines w0.1: -5.6,-5.1 -5.1,-5.1 ; -5.6,5.1 -5.1,5.1 ; -5.1,-5.6 -5.1,-5.1 ; -5.1,-4.6 -5.1,-5.1 ; -5.1,4.6 -5.1,5.1 ; -5.1,5.6 -5.1,5.1 ; -4.6,-5.1 -5.1,-5.1 ; -4.6,5.1 -5.1,5.1 ; -0.5,0 0,0 ; 0,-0.5 0,0 ; 0,0.5 0,0 ; 0.5,0 0,0 ; 4.6,-5.1 5.1,-5.1 ; 4.6,5.1 5.1,5.1 ; 5.1,-5.6 5.1,-5.1 ; 5.1,-4.6 5.1,-5.1 ; 5.1,4.6 5.1,5.1 ; 5.1,5.6 5.1,5.1 ; 5.6,-5.1 5.1,-5.1 ; 5.6,5.1 5.1,5.1
Mechanical 14:
  circle w0.1: c-6,6 r0.75
  lines w0.1: -7.5,-7.5 7.5,-7.5 7.5,7.5 -7.5,7.5 -7.5,-7.5
3D body "XFMR_VIGORTRONIX_VTX-111-010.stp": height 15.5, standoff -3.6, extent -7.5,-7.5 7.5,7.5

## XFMR_WURTH_749010013 [mm] "10/100/1000 Base-Tx  LAN Transformer, Body 7.11 x 12.95mm"
height 5.33
pads (16):
  rect 1.91x0.76 smd: 1(-4.318,4.445) 2(-4.318,3.175) 3(-4.318,1.905) 4(-4.318,0.635) 5(-4.318,-0.635) 6(-4.318,-1.905) 7(-4.318,-3.175) 8(-4.318,-4.445) 9(4.318,-4.445) 10(4.318,-3.175) 11(4.318,-1.905) 12(4.318,-0.635) 13(4.318,0.635) 14(4.318,1.905) 15(4.318,3.175) 16(4.318,4.445)
Top Overlay:
  circle w0.4: c-5.28,5.715 r0.2
  lines w0.2: -3.063,-6.475 3.063,-6.475 3.063,6.475 0.4,6.475 cw(c0,6.475) -0.4,6.475 -3.063,6.475 -3.063,-6.475
Mechanical 8:
  drawing of 196 lines, arcs and shapes, not listed
Mechanical 14:
  circle w0.1: c-2.055,4.975 r0.4
  lines w0.1: -3.555,-6.475 3.555,-6.475 3.555,6.475 -3.555,6.475 -3.555,-6.475
Mechanical 15:
  lines w0.05: -5.523,-6.725 -5.523,6.725 5.523,6.725 5.523,-6.725 -5.523,-6.725
3D body "XFMR_WURTH_749010013.stp": height 5.33, standoff 0, extent -4.7,-6.475 4.7,6.475

## XFMR_WURTH_7490100111A [mm] "10/100 Base-Tx  LAN Transformer, Body 9.05 x 12.95mm"
height 6.35
pads (16):
  rect 1.91x0.64 smd: 1(-4.385,4.445) 2(-4.385,3.175) 3(-4.385,1.905) 4(-4.385,0.635) 5(-4.385,-0.635) 6(-4.385,-1.905) 7(-4.385,-3.175) 8(-4.385,-4.445) 9(4.385,-4.445) 10(4.385,-3.175) 11(4.385,-1.905) 12(4.385,-0.635) 13(4.385,0.635) 14(4.385,1.905) 15(4.385,3.175) 16(4.385,4.445)
Top Overlay:
  circle w0.4: c-5.28,5.715 r0.2
  lines w0.2: -4.525,-5.115 -4.525,-6.525 4.525,-6.525 4.525,-5.115 ; -4.525,5.115 -4.525,6.525 4.525,6.525 4.525,5.115 ; -3.4,-6.525 -3.4,-5.115 ; -3.4,5.115 -3.4,6.525 ; 3.4,-6.525 3.4,-5.115 ; 3.4,5.115 3.4,6.525
Mechanical 8:
  lines w0.05: -4.885,-4.445 -4.385,-4.445 ; -4.885,-3.175 -4.385,-3.175 ; -4.885,-1.905 -4.385,-1.905 ; -4.885,-0.635 -4.385,-0.635 ; -4.885,0.635 -4.385,0.635 ; -4.885,1.905 -4.385,1.905 ; -4.885,3.175 -4.385,3.175 ; -4.885,4.445 -4.385,4.445 ; -4.385,-4.945 -4.385,-4.445 ; -4.385,-3.945 -4.385,-4.445 ; -4.385,-3.675 -4.385,-3.175 ; -4.385,-2.675 -4.385,-3.175 ; -4.385,-2.405 -4.385,-1.905 ; -4.385,-1.405 -4.385,-1.905 ; -4.385,-1.135 -4.385,-0.635 ; -4.385,-0.135 -4.385,-0.635 ; -4.385,0.135 -4.385,0.635 ; -4.385,1.135 -4.385,0.635 ; -4.385,1.405 -4.385,1.905 ; -4.385,2.405 -4.385,1.905 ; -4.385,2.675 -4.385,3.175 ; -4.385,3.675 -4.385,3.175 ; -4.385,3.945 -4.385,4.445 ; -4.385,4.945 -4.385,4.445 ; -3.885,-4.445 -4.385,-4.445 ; -3.885,-3.175 -4.385,-3.175 ; -3.885,-1.905 -4.385,-1.905 ; -3.885,-0.635 -4.385,-0.635 ; -3.885,0.635 -4.385,0.635 ; -3.885,1.905 -4.385,1.905 ; -3.885,3.175 -4.385,3.175 ; -3.885,4.445 -4.385,4.445 ; -0.5,0 0,0 ; 0,-0.5 0,0 ; 0,0.5 0,0 ; 0.5,0 0,0 ; 3.885,-4.445 4.385,-4.445 ; 3.885,-3.175 4.385,-3.175 ; 3.885,-1.905 4.385,-1.905 ; 3.885,-0.635 4.385,-0.635 ; 3.885,0.635 4.385,0.635 ; 3.885,1.905 4.385,1.905 ; 3.885,3.175 4.385,3.175 ; 3.885,4.445 4.385,4.445 ; 4.385,-4.945 4.385,-4.445 ; 4.385,-3.945 4.385,-4.445 ; 4.385,-3.675 4.385,-3.175 ; 4.385,-2.675 4.385,-3.175 ; 4.385,-2.405 4.385,-1.905 ; 4.385,-1.405 4.385,-1.905 ; 4.385,-1.135 4.385,-0.635 ; 4.385,-0.135 4.385,-0.635 ; 4.385,0.135 4.385,0.635 ; 4.385,1.135 4.385,0.635 ; 4.385,1.405 4.385,1.905 ; 4.385,2.405 4.385,1.905 ; 4.385,2.675 4.385,3.175 ; 4.385,3.675 4.385,3.175 ; 4.385,3.945 4.385,4.445 ; 4.385,4.945 4.385,4.445 ; 4.885,-4.445 4.385,-4.445 ; 4.885,-3.175 4.385,-3.175 ; 4.885,-1.905 4.385,-1.905 ; 4.885,-0.635 4.385,-0.635 ; 4.885,0.635 4.385,0.635 ; 4.885,1.905 4.385,1.905 ; 4.885,3.175 4.385,3.175 ; 4.885,4.445 4.385,4.445 ; -5.34,-4.765 -3.43,-4.765 -3.43,-4.125 -5.34,-4.125 -5.34,-4.765 ; -5.34,-3.495 -3.43,-3.495 -3.43,-2.855 -5.34,-2.855 -5.34,-3.495 ; -5.34,-2.225 -3.43,-2.225 -3.43,-1.585 -5.34,-1.585 -5.34,-2.225 ; -5.34,-0.955 -3.43,-0.955 -3.43,-0.315 -5.34,-0.315 -5.34,-0.955 ; -5.34,0.315 -3.43,0.315 -3.43,0.955 -5.34,0.955 -5.34,0.315 ; -5.34,1.585 -3.43,1.585 -3.43,2.225 -5.34,2.225 -5.34,1.585 ; -5.34,2.855 -3.43,2.855 -3.43,3.495 -5.34,3.495 -5.34,2.855 ; -5.34,4.125 -3.43,4.125 -3.43,4.765 -5.34,4.765 -5.34,4.125 ; 3.43,-4.765 5.34,-4.765 5.34,-4.125 3.43,-4.125 3.43,-4.765 ; 3.43,-3.495 5.34,-3.495 5.34,-2.855 3.43,-2.855 3.43,-3.495 ; 3.43,-2.225 5.34,-2.225 5.34,-1.585 3.43,-1.585 3.43,-2.225 ; 3.43,-0.955 5.34,-0.955 5.34,-0.315 3.43,-0.315 3.43,-0.955 ; 3.43,0.315 5.34,0.315 5.34,0.955 3.43,0.955 3.43,0.315 ; 3.43,1.585 5.34,1.585 5.34,2.225 3.43,2.225 3.43,1.585 ; 3.43,2.855 5.34,2.855 5.34,3.495 3.43,3.495 3.43,2.855 ; 3.43,4.125 5.34,4.125 5.34,4.765 3.43,4.765 3.43,4.125
Mechanical 14:
  circle w0.1: c-2.055,4.975 r0.4
  lines w0.1: -4.525,-4.596 -4.825,-4.596 -4.825,-4.294 -4.525,-4.294 ; -4.525,-3.326 -4.825,-3.326 -4.825,-3.024 -4.525,-3.024 ; -4.525,-2.056 -4.825,-2.056 -4.825,-1.754 -4.525,-1.754 ; -4.525,-0.786 -4.825,-0.786 -4.825,-0.484 -4.525,-0.484 ; -4.525,0.484 -4.825,0.484 -4.825,0.786 -4.525,0.786 ; -4.525,1.754 -4.825,1.754 -4.825,2.056 -4.525,2.056 ; -4.525,3.024 -4.825,3.024 -4.825,3.326 -4.525,3.326 ; -4.525,4.294 -4.825,4.294 -4.825,4.596 -4.525,4.596 ; -3.4,-6.525 -3.4,6.525 ; 3.4,-6.525 3.4,6.525 ; 4.525,-4.596 4.825,-4.596 4.825,-4.294 4.525,-4.294 ; 4.525,-3.326 4.825,-3.326 4.825,-3.024 4.525,-3.024 ; 4.525,-2.056 4.825,-2.056 4.825,-1.754 4.525,-1.754 ; 4.525,-0.786 4.825,-0.786 4.825,-0.484 4.525,-0.484 ; 4.525,0.484 4.825,0.484 4.825,0.786 4.525,0.786 ; 4.525,1.754 4.825,1.754 4.825,2.056 4.525,2.056 ; 4.525,3.024 4.825,3.024 4.825,3.326 4.525,3.326 ; 4.525,4.294 4.825,4.294 4.825,4.596 4.525,4.596 ; -4.525,-6.525 -4.525,6.525 4.525,6.525 4.525,-6.525 -4.525,-6.525
Mechanical 15:
  lines w0.1: -5.59,-6.775 5.59,-6.775 5.59,6.775 -5.59,6.775 -5.59,-6.775
3D body "XFMR_WURTH_7490100111A.stp": height 6.35, standoff 0, extent -4.7,-6.35 4.7,6.35